# Altium schematic symbol library SparkFun.SCHLIB: 796 symbols (part 2 of 5) (continued)
## JOYSTICK-PSP1000 (continued)
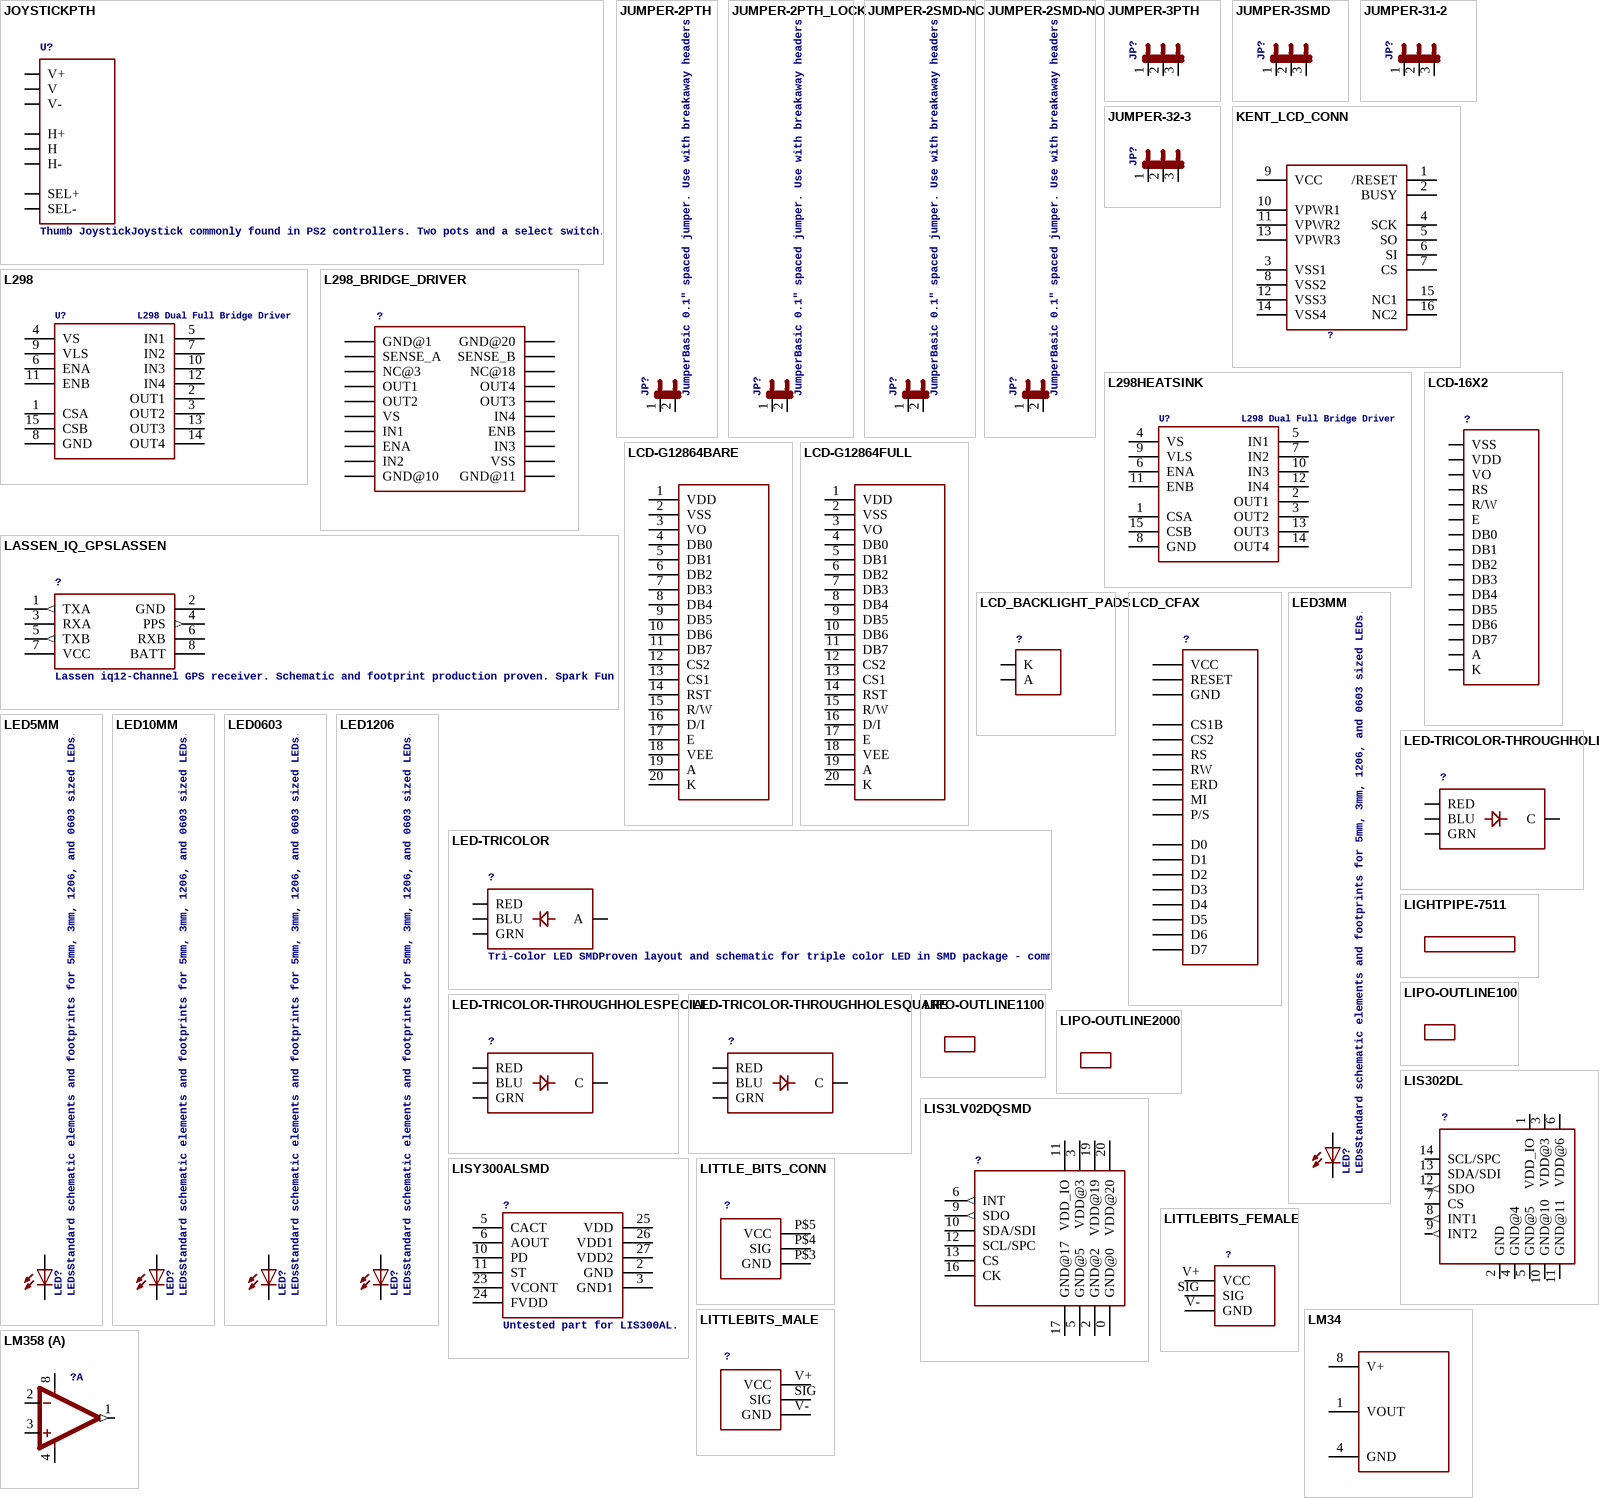
[diagram p18: symbols JOYSTICKPTH to LM358]

## JOYSTICKPTH
designator U?, comment Thumb JoystickJoystick commonly found in PS2 controllers. Two pots and a select switch. Footprint proven. Spark Fun Electronics SKU : COM-09032
footprint JOYSTICK
pins: B1A SEL+, B2A SEL-, H1 H+, H2 H, H3 H-, V1 V+, V2 V, V3 V-

## JUMPER-2PTH
designator JP?, comment JumperBasic 0.1" spaced jumper. Use with breakaway headers.
footprint 1X02
pins: 1, 2

## JUMPER-2PTH_LOCK
designator JP?, comment JumperBasic 0.1" spaced jumper. Use with breakaway headers.
footprint 1X02_LOCK
pins: 1, 2

## JUMPER-2SMD-NC
designator JP?, comment JumperBasic 0.1" spaced jumper. Use with breakaway headers.
footprint SJ_2S
pins: 1, 2

## JUMPER-2SMD-NO
designator JP?, comment JumperBasic 0.1" spaced jumper. Use with breakaway headers.
footprint SJ_2S-NO
pins: 1, 2

## JUMPER-3PTH
designator JP?
footprint 1X03
pins: 1, 2, 3

## JUMPER-3SMD
designator JP?
footprint SJ_3
pins: 1, 2, 3

## JUMPER-31-2
designator JP?
footprint SJ_3_PASTE1&2
pins: 1, 2, 3

## JUMPER-32-3
designator JP?
footprint SJ_3_PASTE2&3
pins: 1, 2, 3

## KENT_LCD_CONN
designator ?
footprint FFC_16
pins: 1 /RESET, 2 BUSY, 3 VSS1, 4 SCK, 5 SO, 6 SI, 7 CS, 8 VSS2, 9 VCC, 10 VPWR1, 11 VPWR2, 12 VSS3, 13 VPWR3, 14 VSS4, 15 NC1, 16 NC2

## L298
designator U?, comment L298 Dual Full Bridge Driver
footprint MULTIWATT15
pins: 1 CSA, 2 OUT1, 3 OUT2, 4 VS, 5 IN1, 6 ENA, 7 IN2, 8 GND, 9 VLS, 10 IN3, 11 ENB, 12 IN4, 13 OUT3, 14 OUT4, 15 CSB

## L298_BRIDGE_DRIVER
designator ?
footprint POWERSO20
pins: P$1 GND@1, P$2 SENSE_A, P$3 NC@3, P$4 OUT1, P$5 OUT2, P$6 VS, P$7 IN1, P$8 ENA, P$9 IN2, P$10 GND@10, P$11 GND@11, P$12 VSS, P$13 IN3, P$14 ENB, P$15 IN4, P$16 OUT3, P$17 OUT4, P$18 NC@18, P$19 SENSE_B, P$20 GND@20

## L298HEATSINK
designator U?, comment L298 Dual Full Bridge Driver
footprint MULTIWATT15_6400BGHEATSINK
pins: 1 CSA, 2 OUT1, 3 OUT2, 4 VS, 5 IN1, 6 ENA, 7 IN2, 8 GND, 9 VLS, 10 IN3, 11 ENB, 12 IN4, 13 OUT3, 14 OUT4, 15 CSB

## LASSEN_IQ_GPSLASSEN
designator ?, comment Lassen iq12-Channel GPS receiver. Schematic and footprint production proven. Spark Fun Electronics SKU : GPS-00163. Surface mount mating connector : GPS-00170
footprint LASSEN_IQ_GPS
pins: 1 TXA (out), 2 GND (power), 3 RXA, 4 PPS (out), 5 TXB (out), 6 RXB, 7 VCC (power), 8 BATT (power)

## LCD-16X2
designator ?
footprint LCD-16X2
pins: 1 VSS (power), 2 VDD (power), 3 VO, 4 RS, 5 R/W, 6 E, 7 DB0, 8 DB1, 9 DB2, 10 DB3, 11 DB4, 12 DB5, 13 DB6, 14 DB7, 15 A (power), 16 K (power)

## LCD-G12864BARE
designator ?, comment Graphical LCD 128x64Footprint is not yet proven. Double check it. Spark Fun Electronics SKU : LCD-00710  (value not drawn)
footprint 1X20
pins: 1 VDD (power), 2 VSS (power), 3 VO, 4 DB0, 5 DB1, 6 DB2, 7 DB3, 8 DB4, 9 DB5, 10 DB6, 11 DB7, 12 CS2, 13 CS1, 14 RST, 15 R/W, 16 D/I, 17 E, 18 VEE, 19 A (power), 20 K (power)

## LCD-G12864FULL
designator ?, comment Graphical LCD 128x64Footprint is not yet proven. Double check it. Spark Fun Electronics SKU : LCD-00710  (value not drawn)
footprint LCD-G12864
pins: 1 VDD (power), 2 VSS (power), 3 VO, 4 DB0, 5 DB1, 6 DB2, 7 DB3, 8 DB4, 9 DB5, 10 DB6, 11 DB7, 12 CS2, 13 CS1, 14 RST, 15 R/W, 16 D/I, 17 E, 18 VEE, 19 A (power), 20 K (power)

## LCD_BACKLIGHT_PADS
designator ?
footprint LCD_BACKLIGHT_PADS
pins: P$1 A, P$2 K

## LCD_CFAX
designator ?
footprint LCD_CFAX
pins: P$1 VCC, P$2 GND, P$3 CS1B, P$4 CS2, P$5 RESET, P$6 RS, P$7 RW, P$8 ERD, P$9 D0, P$10 D1, P$11 D2, P$12 D3, P$13 D4, P$14 D5, P$15 D6, P$16 D7, P$17 MI, P$18 P/S

## LED3MM
designator LED?, comment LEDsStandard schematic elements and footprints for 5mm, 3mm, 1206, and 0603 sized LEDs. 5mm - Spark Fun Electronics SKU : COM-00529 (and others)
footprint LED3MM
pins: A, K C

## LED5MM
designator LED?, comment LEDsStandard schematic elements and footprints for 5mm, 3mm, 1206, and 0603 sized LEDs. 5mm - Spark Fun Electronics SKU : COM-00529 (and others)
footprint LED5MM
pins: A, K C

## LED10MM
designator LED?, comment LEDsStandard schematic elements and footprints for 5mm, 3mm, 1206, and 0603 sized LEDs. 5mm - Spark Fun Electronics SKU : COM-00529 (and others)
footprint LED10MM
pins: A, C

## LED0603
designator LED?, comment LEDsStandard schematic elements and footprints for 5mm, 3mm, 1206, and 0603 sized LEDs. 5mm - Spark Fun Electronics SKU : COM-00529 (and others)
footprint LED-0603
pins: A, C

## LED1206
designator LED?, comment LEDsStandard schematic elements and footprints for 5mm, 3mm, 1206, and 0603 sized LEDs. 5mm - Spark Fun Electronics SKU : COM-00529 (and others)
footprint LED-1206
pins: A, C

## LED-TRICOLOR
designator ?, comment Tri-Color LED SMDProven layout and schematic for triple color LED in SMD package - common anode. Spark Fun Electronics SKU : COM-07844
footprint LED-TRICOLOR-SMD
pins: A, B BLU, G GRN, R RED

## LED-TRICOLOR-THROUGHHOLE
designator ?
footprint LED-TRICOLOR-THROUGHHOLE
pins: BLU, GND C, GRN, RED

## LED-TRICOLOR-THROUGHHOLESPECIAL
designator ?
footprint LED-TRICOLOR-PTH_SPECIAL
pins: BLU, GND C, GRN, RED

## LED-TRICOLOR-THROUGHHOLESQUARE
designator ?
footprint LED-TRICOLOR-PTH-SQUARE
pins: B BLU, C, G GRN, R RED

## LIGHTPIPE-7511
designator ?
footprint LIGHTPIPE-7511

## LIPO-OUTLINE100
designator ?
footprint LIPO-100

## LIPO-OUTLINE1100
designator ?
footprint LIPO-1100

## LIPO-OUTLINE2000
designator ?
footprint LIPO-2000

## LIS3LV02DQSMD
designator ?
footprint QFN-28
pins: 0 GND@0 (power), 2 GND@2 (power), 3 VDD@3 (power), 5 GND@5 (power), 6 INT (out), 9 SDO (out), 10 SDA/SDI, 11 VDD_IO (power), 12 SCL/SPC, 13 CS, 16 CK, 17 GND@17 (power), 19 VDD@19 (power), 20 VDD@20 (power)

## LIS302DL
designator ?
footprint LGA14
pins: 1 VDD_IO (power), 2 GND (power), 3 VDD@3 (power), 4 GND@4 (power), 5 GND@5 (power), 6 VDD@6 (power), 7 CS, 8 INT1 (out), 9 INT2 (out), 10 GND@10 (power), 11 GND@11 (power), 12 SDO (out), 13 SDA/SDI, 14 SCL/SPC

## LISY300ALSMD
designator ?, comment Untested part for LIS300AL.
footprint LGA28
pins: 2 GND, 3 GND1, 5 CACT, 6 AOUT, 10 PD, 11 ST, 23 VCONT, 24 FVDD, 25 VDD, 26 VDD1, 27 VDD2

## LITTLE_BITS_CONN
designator ?
footprint LITTLEBITS
pins: P$3 GND, P$4 SIG, P$5 VCC

## LITTLEBITS_FEMALE
designator ?
footprint LITTLE_BITS_FEMALE
pins: SIG, V+ VCC, V- GND

## LITTLEBITS_MALE
designator ?
footprint LITTLE_BITS_MALE
pins: SIG, V+ VCC, V- GND

## LM34
designator ?
footprint SO08
pins: 1 VOUT, 4 GND, 8 V+

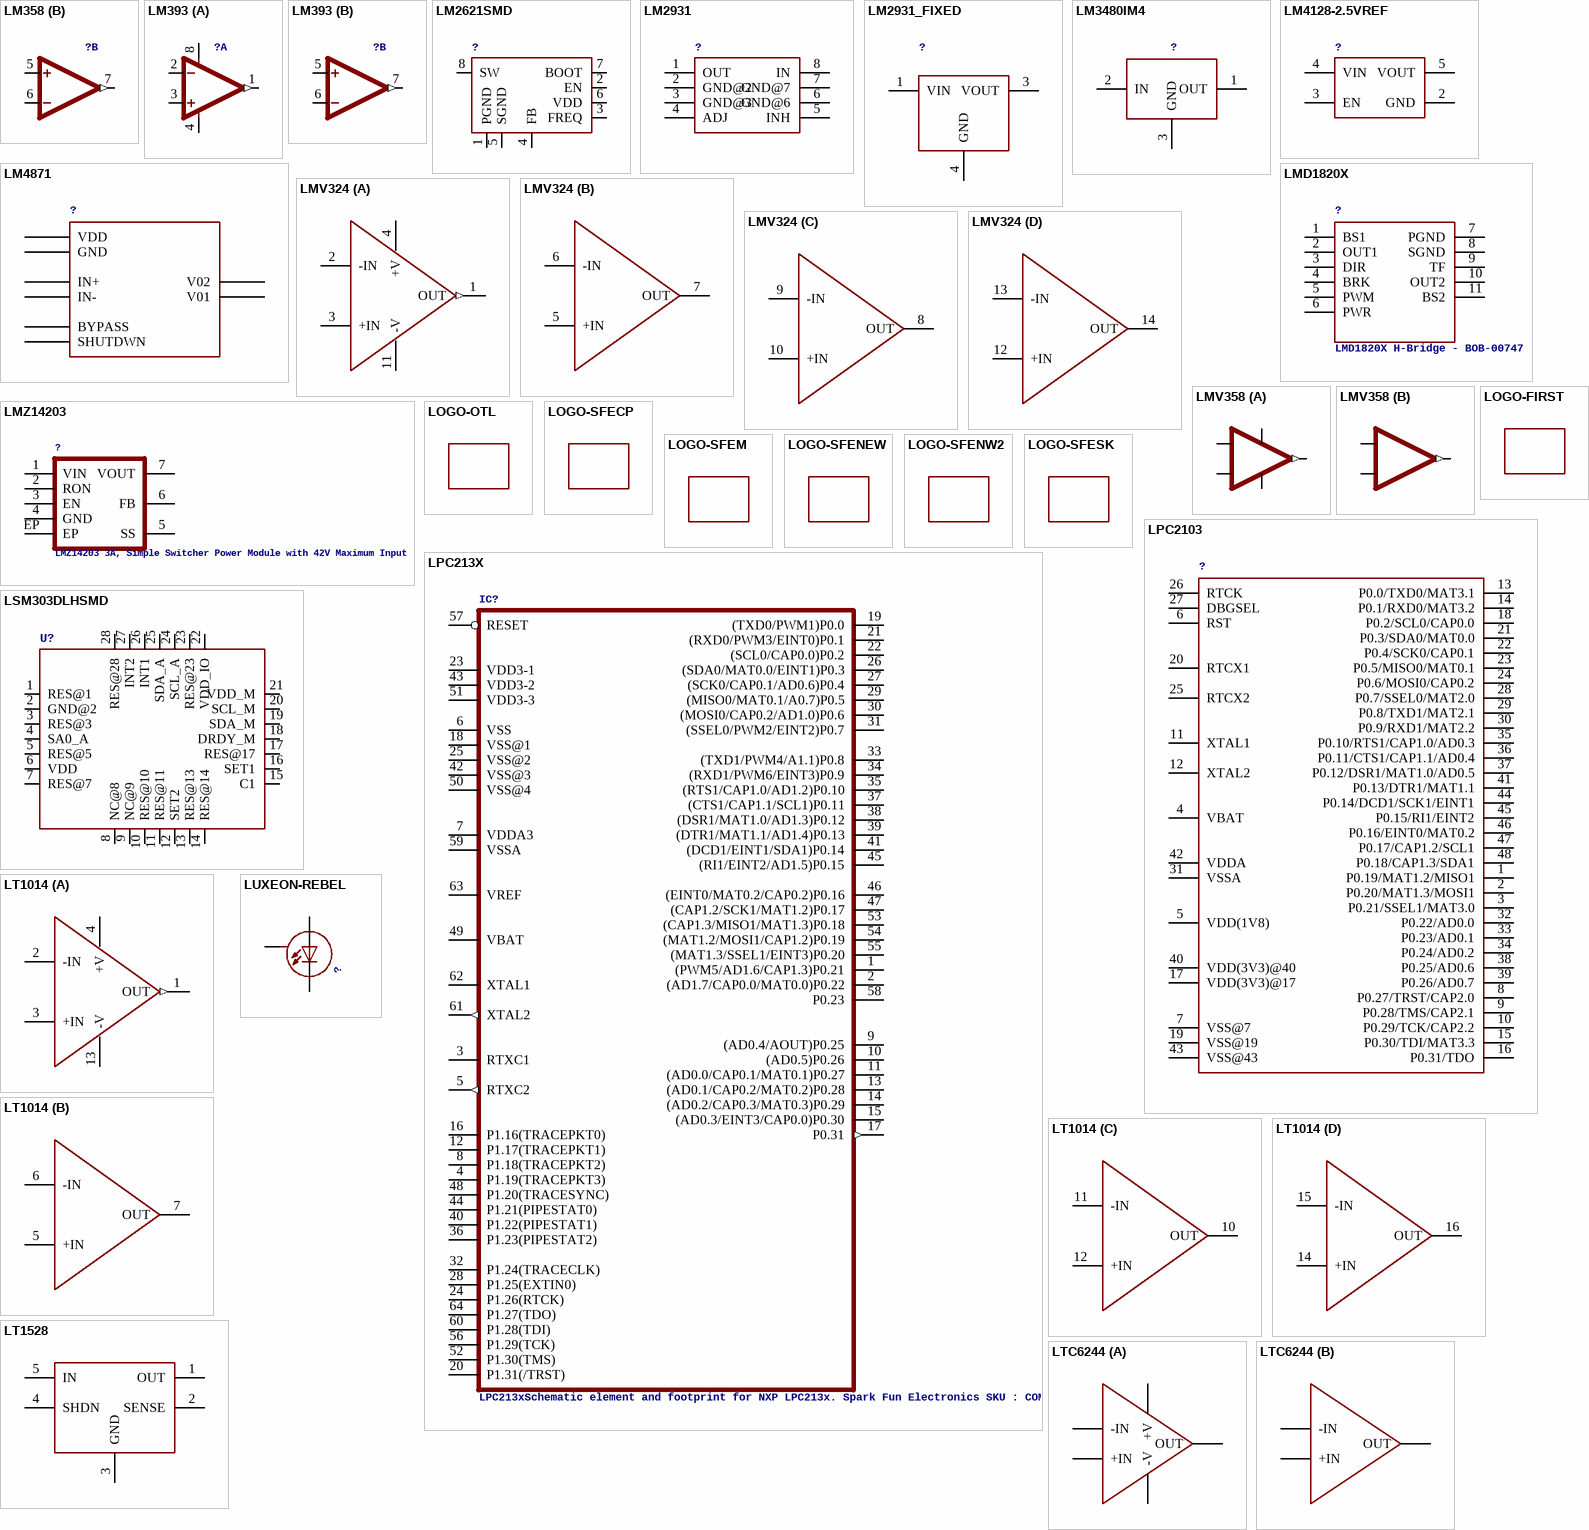
[diagram p19: symbols LM358 to LUXEON-REBEL]

## LM358
designator ?
footprint DIP08
part A pins: 1 OUT (out), 2 -IN, 3 +IN, 4 V- (power), 8 V+ (power)
part B pins: 5 +IN, 6 -IN, 7 OUT (out)

## LM393
designator ?
footprint SO08
part A pins: 1 OUT (out), 2 -IN, 3 +IN, 4 V- (power), 8 V+ (power)
part B pins: 5 +IN, 6 -IN, 7 OUT (out)

## LM2621SMD
designator ?
footprint MSOP-8
pins: 1 PGND, 2 EN, 3 FREQ, 4 FB, 5 SGND, 6 VDD, 7 BOOT, 8 SW

## LM2931
designator ?
footprint SO08
pins: 1 OUT, 2 GND@2, 3 GND@3, 4 ADJ, 5 INH, 6 GND@6, 7 GND@7, 8 IN

## LM2931_FIXED
designator ?
footprint DPAK
pins: 1 VIN, 3 VOUT, 4 GND

## LM3480IM4
designator ?
footprint SOT23-3
pins: 1 OUT, 2 IN, 3 GND

## LM4128-2.5VREF
designator ?
footprint SOT23-5
pins: 2 GND, 3 EN, 4 VIN, 5 VOUT

## LM4871
designator ?
footprint SO08
pins: 1 SHUTDWN, 2 BYPASS, 3 IN+, 4 IN-, 5 V01, 6 VDD, 7 GND, 8 V02

## LMD1820X
designator ?, comment LMD1820X H-Bridge - BOB-00747
footprint TO-220-11LEAD
pins: 1 BS1, 2 OUT1, 3 DIR, 4 BRK, 5 PWM, 6 PWR, 7 PGND, 8 SGND, 9 TF, 10 OUT2, 11 BS2

## LMV324
designator ?
footprint SO014
part A pins: 1 OUT (out), 2 -IN, 3 +IN, 4 +V (power), 11 -V (power)
part B pins: 5 +IN (power), 6 -IN (power), 7 OUT (power)
part C pins: 8 OUT (power), 9 -IN (power), 10 +IN (power)
part D pins: 12 +IN (power), 13 -IN (power), 14 OUT (power)

## LMV358
designator ?
footprint SO08
part A pins: 1 OUT1 (out), 2 -IN1, 3 +IN1, 4 GND (power), 8 +V (power)
part B pins: 5 +IN2, 6 -IN2, 7 OUT2 (out)

## LMZ14203
designator ?, comment LMZ14203 3A, Simple Switcher Power Module with 42V Maximum Input
footprint TO-PMOD-7
pins: 1 VIN, 2 RON, 3 EN, 4 GND, 5 SS, 6 FB, 7 VOUT, EP

## LOGO-FIRST
designator ?
footprint FRIST_LOGO

## LOGO-OTL
designator ?
footprint OVERTONE_LOGO

## LOGO-SFECP
designator JP?, comment Spark Fun Electronics PCB LogoThis is the standard Spark Fun Electronics PCB logo.  (value not drawn)
footprint SFE-LOGO-FLAME-COPPER

## LOGO-SFEM
designator JP?, comment Spark Fun Electronics PCB LogoThis is the standard Spark Fun Electronics PCB logo.  (value not drawn)
footprint SFE-LOGO

## LOGO-SFENEW
designator JP?, comment Spark Fun Electronics PCB LogoThis is the standard Spark Fun Electronics PCB logo.  (value not drawn)
footprint SFE-NEW-WEBLOGO

## LOGO-SFENW2
designator JP?, comment Spark Fun Electronics PCB LogoThis is the standard Spark Fun Electronics PCB logo.  (value not drawn)
footprint SFE-NEW-WEB

## LOGO-SFESK
designator JP?, comment Spark Fun Electronics PCB LogoThis is the standard Spark Fun Electronics PCB logo.  (value not drawn)
footprint SFE-LOGO-FLAME

## LPC213X
designator IC?, comment LPC213xSchematic element and footprint for NXP LPC213x. Spark Fun Electronics SKU : COM-00520
footprint SQFP-S-10X10-64
pins: 1 (PWM5/AD1.6/CAP1.3)P0.21, 2 (AD1.7/CAP0.0/MAT0.0)P0.22, 3 RTXC1, 4 P1.19(TRACEPKT3), 5 RTXC2 (out), 6 VSS (power), 7 VDDA3 (power), 8 P1.18(TRACEPKT2), 9 (AD0.4/AOUT)P0.25, 10 (AD0.5)P0.26, 11 (AD0.0/CAP0.1/MAT0.1)P0.27, 12 P1.17(TRACEPKT1), 13 (AD0.1/CAP0.2/MAT0.2)P0.28, 14 (AD0.2/CAP0.3/MAT0.3)P0.29, 15 (AD0.3/EINT3/CAP0.0)P0.30, 16 P1.16(TRACEPKT0), 17 P0.31 (out), 18 VSS@1 (power), 19 (TXD0/PWM1)P0.0, 20 P1.31(/TRST), 21 (RXD0/PWM3/EINT0)P0.1, 22 (SCL0/CAP0.0)P0.2, 23 VDD3-1 (power), 24 P1.26(RTCK), 25 VSS@2 (power), 26 (SDA0/MAT0.0/EINT1)P0.3, 27 (SCK0/CAP0.1/AD0.6)P0.4, 28 P1.25(EXTIN0), 29 (MISO0/MAT0.1/A0.7)P0.5, 30 (MOSI0/CAP0.2/AD1.0)P0.6, 31 (SSEL0/PWM2/EINT2)P0.7, 32 P1.24(TRACECLK), 33 (TXD1/PWM4/A1.1)P0.8, 34 (RXD1/PWM6/EINT3)P0.9, 35 (RTS1/CAP1.0/AD1.2)P0.10, 36 P1.23(PIPESTAT2), 37 (CTS1/CAP1.1/SCL1)P0.11, 38 (DSR1/MAT1.0/AD1.3)P0.12, 39 (DTR1/MAT1.1/AD1.4)P0.13, 40 P1.22(PIPESTAT1), 41 (DCD1/EINT1/SDA1)P0.14, 42 VSS@3 (power), 43 VDD3-2 (power), 44 P1.21(PIPESTAT0), 45 (RI1/EINT2/AD1.5)P0.15, 46 (EINT0/MAT0.2/CAP0.2)P0.16, 47 (CAP1.2/SCK1/MAT1.2)P0.17, 48 P1.20(TRACESYNC), 49 VBAT (power), 50 VSS@4 (power), 51 VDD3-3 (power), 52 P1.30(TMS), 53 (CAP1.3/MISO1/MAT1.3)P0.18, 54 (MAT1.2/MOSI1/CAP1.2)P0.19, 55 (MAT1.3/SSEL1/EINT3)P0.20, 56 P1.29(TCK), 57 RESET, 58 P0.23, 59 VSSA (power), 60 P1.28(TDI), 61 XTAL2 (out), 62 XTAL1, 63 VREF, 64 P1.27(TDO)

## LPC2103
designator ?
footprint LQFP-48
pins: 1 P0.19/MAT1.2/MISO1, 2 P0.20/MAT1.3/MOSI1, 3 P0.21/SSEL1/MAT3.0, 4 VBAT, 5 VDD(1V8), 6 RST, 7 VSS@7, 8 P0.27/TRST/CAP2.0, 9 P0.28/TMS/CAP2.1, 10 P0.29/TCK/CAP2.2, 11 XTAL1, 12 XTAL2, 13 P0.0/TXD0/MAT3.1, 14 P0.1/RXD0/MAT3.2, 15 P0.30/TDI/MAT3.3, 16 P0.31/TDO, 17 VDD(3V3)@17, 18 P0.2/SCL0/CAP0.0, 19 VSS@19, 20 RTCX1, 21 P0.3/SDA0/MAT0.0, 22 P0.4/SCK0/CAP0.1, 23 P0.5/MISO0/MAT0.1, 24 P0.6/MOSI0/CAP0.2, 25 RTCX2, 26 RTCK, 27 DBGSEL, 28 P0.7/SSEL0/MAT2.0, 29 P0.8/TXD1/MAT2.1, 30 P0.9/RXD1/MAT2.2, 31 VSSA, 32 P0.22/AD0.0, 33 P0.23/AD0.1, 34 P0.24/AD0.2, 35 P0.10/RTS1/CAP1.0/AD0.3, 36 P0.11/CTS1/CAP1.1/AD0.4, 37 P0.12/DSR1/MAT1.0/AD0.5, 38 P0.25/AD0.6, 39 P0.26/AD0.7, 40 VDD(3V3)@40, 41 P0.13/DTR1/MAT1.1, 42 VDDA, 43 VSS@43, 44 P0.14/DCD1/SCK1/EINT1, 45 P0.15/RI1/EINT2, 46 P0.16/EINT0/MAT0.2, 47 P0.17/CAP1.2/SCL1, 48 P0.18/CAP1.3/SDA1

## LSM303DLHSMD
designator U?
footprint LGA28-5X5
pins: 1 RES@1, 2 GND@2, 3 RES@3, 4 SA0_A, 5 RES@5, 6 VDD, 7 RES@7, 8 NC@8, 9 NC@9, 10 RES@10, 11 RES@11, 12 SET2, 13 RES@13, 14 RES@14, 15 C1, 16 SET1, 17 RES@17, 18 DRDY_M, 19 SDA_M, 20 SCL_M, 21 VDD_M, 22 VDD_IO, 23 RES@23, 24 SCL_A, 25 SDA_A, 26 INT1, 27 INT2, 28 RES@28

## LT1014
designator ?
footprint SO16L
part A pins: 1 OUT (out), 2 -IN, 3 +IN, 4 +V (power), 13 -V (power)
part B pins: 5 +IN (power), 6 -IN (power), 7 OUT (power)
part C pins: 10 OUT (power), 11 -IN (power), 12 +IN (power)
part D pins: 14 +IN (power), 15 -IN (power), 16 OUT (power)

## LT1528
designator ?, comment LT1528High current voltage regulator commonly used with GM862 cellular module. Spark Fun Electronics SKU : COM-00311. Footprint may need to have the large paste aperature reduced.  (value not drawn)
footprint Q5-DD
pins: 1 OUT, 2 SENSE, 3 GND, 4 SHDN, 5 IN

## LTC6244
designator ?
footprint MSOP8
part A pins: ?1 -IN, ?2 +IN, ?3 -V, ?4 +V, ?5 OUT
part B pins: ? -IN, ? +IN, ? OUT

## LUXEON-REBEL
designator ?
footprint LUXEON-REBEL
pins: ANODE A, CATHODE C, P$3 S

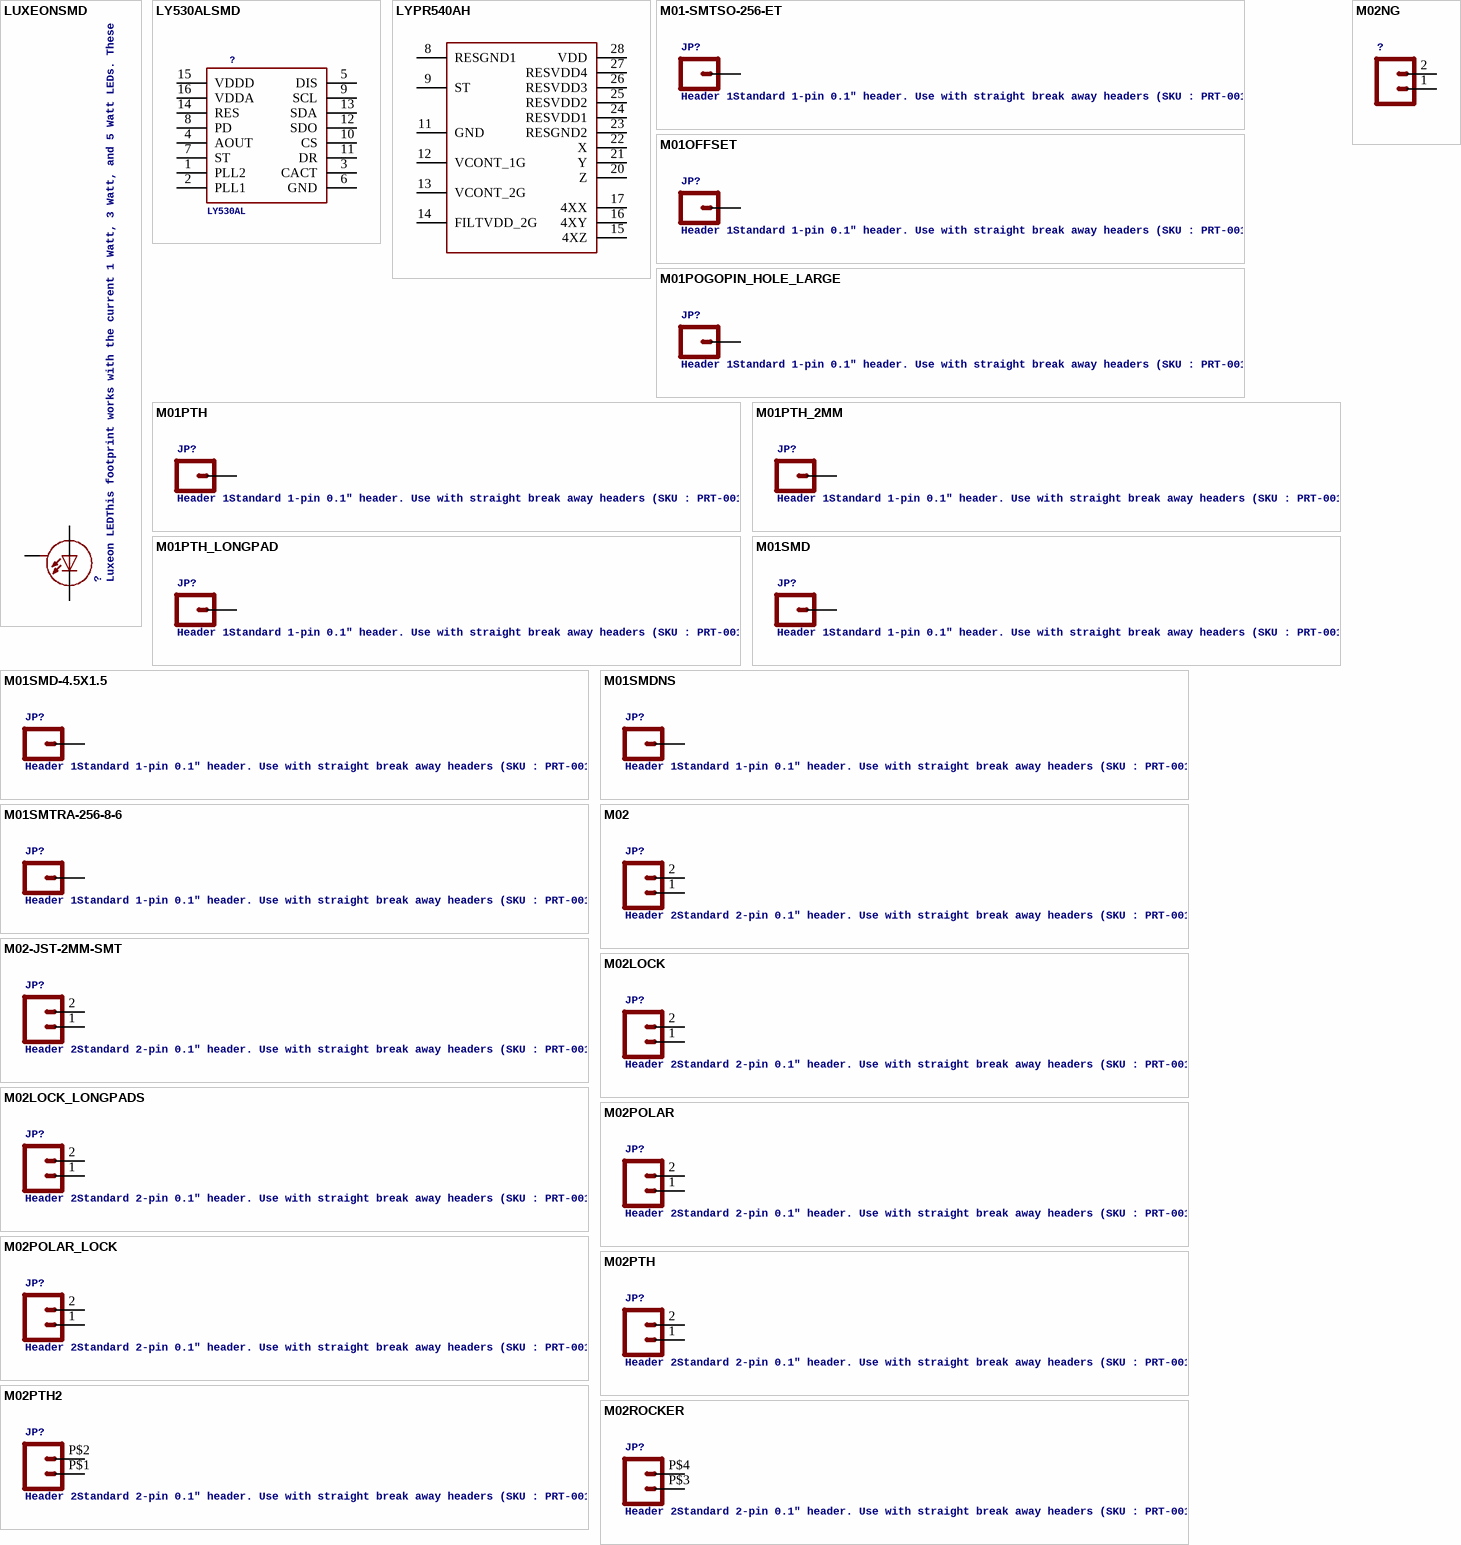
[diagram p20: symbols LUXEONSMD to M02ROCKER]

## LUXEONSMD
designator ?, comment Luxeon LEDThis footprint works with the current 1 Watt, 3 Watt, and 5 Watt LEDs. These blindingly bright LEDs generate a lot of heat so the footprint has a large pad under the LED for thermal transfer. Schematic and footprint are proven. Spark Fun Electronics SKU : COM-00603
footprint LUXEON
pins: A, C, S

## LY530ALSMD
designator ?, comment LY530AL
footprint LGA16
pins: 1 PLL2, 2 PLL1, 3 CACT, 4 AOUT, 5 DIS, 6 GND, 7 ST, 8 PD, 9 SCL, 10 CS, 11 DR, 12 SDO, 13 SDA, 14 RES, 15 VDDD, 16 VDDA

## LYPR540AH
designator ?
footprint LGA28L
pins: 8 RESGND1, 9 ST, 11 GND, 12 VCONT_1G, 13 VCONT_2G, 14 FILTVDD_2G, 15 4XZ, 16 4XY, 17 4XX, 20 Z, 21 Y, 22 X, 23 RESGND2, 24 RESVDD1, 25 RESVDD2, 26 RESVDD3, 27 RESVDD4, 28 VDD

## M01-SMTSO-256-ET
designator JP?, comment Header 1Standard 1-pin 0.1" header. Use with straight break away headers (SKU : PRT-00116), right angle break away headers (PRT-00553), swiss pins (PRT-00743), machine pins (PRT-00117), and female headers (PRT-00115).
footprint SMTSO-256-ET
pins: P$1 1

## M01OFFSET
designator JP?, comment Header 1Standard 1-pin 0.1" header. Use with straight break away headers (SKU : PRT-00116), right angle break away headers (PRT-00553), swiss pins (PRT-00743), machine pins (PRT-00117), and female headers (PRT-00115).
footprint 1X01_OFFSET
pins: 1

## M01POGOPIN_HOLE_LARGE
designator JP?, comment Header 1Standard 1-pin 0.1" header. Use with straight break away headers (SKU : PRT-00116), right angle break away headers (PRT-00553), swiss pins (PRT-00743), machine pins (PRT-00117), and female headers (PRT-00115).
footprint 1X01_POGOPIN_HOLE_LARGE
pins: 1

## M01PTH
designator JP?, comment Header 1Standard 1-pin 0.1" header. Use with straight break away headers (SKU : PRT-00116), right angle break away headers (PRT-00553), swiss pins (PRT-00743), machine pins (PRT-00117), and female headers (PRT-00115).
footprint 1X01
pins: 1

## M01PTH_2MM
designator JP?, comment Header 1Standard 1-pin 0.1" header. Use with straight break away headers (SKU : PRT-00116), right angle break away headers (PRT-00553), swiss pins (PRT-00743), machine pins (PRT-00117), and female headers (PRT-00115).
footprint 1X01_2MM
pins: 1

## M01PTH_LONGPAD
designator JP?, comment Header 1Standard 1-pin 0.1" header. Use with straight break away headers (SKU : PRT-00116), right angle break away headers (PRT-00553), swiss pins (PRT-00743), machine pins (PRT-00117), and female headers (PRT-00115).
footprint 1X01_LONGPAD
pins: 1

## M01SMD
designator JP?, comment Header 1Standard 1-pin 0.1" header. Use with straight break away headers (SKU : PRT-00116), right angle break away headers (PRT-00553), swiss pins (PRT-00743), machine pins (PRT-00117), and female headers (PRT-00115).
footprint LUXEON-PAD
pins: P$1 1

## M01SMD-4.5X1.5
designator JP?, comment Header 1Standard 1-pin 0.1" header. Use with straight break away headers (SKU : PRT-00116), right angle break away headers (PRT-00553), swiss pins (PRT-00743), machine pins (PRT-00117), and female headers (PRT-00115).
footprint PAD-1.5X4.5
pins: P$1 1

## M01SMDNS
designator JP?, comment Header 1Standard 1-pin 0.1" header. Use with straight break away headers (SKU : PRT-00116), right angle break away headers (PRT-00553), swiss pins (PRT-00743), machine pins (PRT-00117), and female headers (PRT-00115).
footprint 1X01NS
pins: 1

## M01SMTRA-256-8-6
designator JP?, comment Header 1Standard 1-pin 0.1" header. Use with straight break away headers (SKU : PRT-00116), right angle break away headers (PRT-00553), swiss pins (PRT-00743), machine pins (PRT-00117), and female headers (PRT-00115).
footprint SMTRA-256-8-6
pins: P$1 1

## M02
designator JP?, comment Header 2Standard 2-pin 0.1" header. Use with straight break away headers (SKU : PRT-00116), right angle break away headers (PRT-00553), swiss pins (PRT-00743), machine pins (PRT-00117), and female headers (PRT-00115). Molex polarized connector foot print use with SKU : PRT-08233 with associated crimp pins and housings.
footprint 1X02_LONGPADS
pins: 1, 2

## M02-JST-2MM-SMT
designator JP?, comment Header 2Standard 2-pin 0.1" header. Use with straight break away headers (SKU : PRT-00116), right angle break away headers (PRT-00553), swiss pins (PRT-00743), machine pins (PRT-00117), and female headers (PRT-00115). Molex polarized connector foot print use with SKU : PRT-08233 with associated crimp pins and housings.
footprint S2B-PH
pins: 1, 2

## M02LOCK
designator JP?, comment Header 2Standard 2-pin 0.1" header. Use with straight break away headers (SKU : PRT-00116), right angle break away headers (PRT-00553), swiss pins (PRT-00743), machine pins (PRT-00117), and female headers (PRT-00115). Molex polarized connector foot print use with SKU : PRT-08233 with associated crimp pins and housings.
footprint 1X02_LOCK
pins: 1, 2

## M02LOCK_LONGPADS
designator JP?, comment Header 2Standard 2-pin 0.1" header. Use with straight break away headers (SKU : PRT-00116), right angle break away headers (PRT-00553), swiss pins (PRT-00743), machine pins (PRT-00117), and female headers (PRT-00115). Molex polarized connector foot print use with SKU : PRT-08233 with associated crimp pins and housings.
footprint 1X02_LOCK_LONGPADS
pins: 1, 2

## M02NG
designator ?
footprint 1X02
pins: 1, 2

## M02POLAR
designator JP?, comment Header 2Standard 2-pin 0.1" header. Use with straight break away headers (SKU : PRT-00116), right angle break away headers (PRT-00553), swiss pins (PRT-00743), machine pins (PRT-00117), and female headers (PRT-00115). Molex polarized connector foot print use with SKU : PRT-08233 with associated crimp pins and housings.
footprint MOLEX-1X2
pins: 1, 2

## M02POLAR_LOCK
designator JP?, comment Header 2Standard 2-pin 0.1" header. Use with straight break away headers (SKU : PRT-00116), right angle break away headers (PRT-00553), swiss pins (PRT-00743), machine pins (PRT-00117), and female headers (PRT-00115). Molex polarized connector foot print use with SKU : PRT-08233 with associated crimp pins and housings.
footprint MOLEX-1X2_LOCK
pins: 1, 2

## M02PTH
designator JP?, comment Header 2Standard 2-pin 0.1" header. Use with straight break away headers (SKU : PRT-00116), right angle break away headers (PRT-00553), swiss pins (PRT-00743), machine pins (PRT-00117), and female headers (PRT-00115). Molex polarized connector foot print use with SKU : PRT-08233 with associated crimp pins and housings.
footprint 1X02
pins: 1, 2